# Altium footprint library myPCBLib (AirPC's conflicted copy 2014-06-14).PcbLib: 57 footprints (part 1 of 4)
Each footprint in its own frame and in the unit in brackets; x right, y up, seen from the top. Pads: shape width x height; smd on the part's side, far side on the other; paste and mask are expansions set on the pad; w line width, h text height; cw(c..) or ccw(c..) is an arc to the next point about the centre after c.
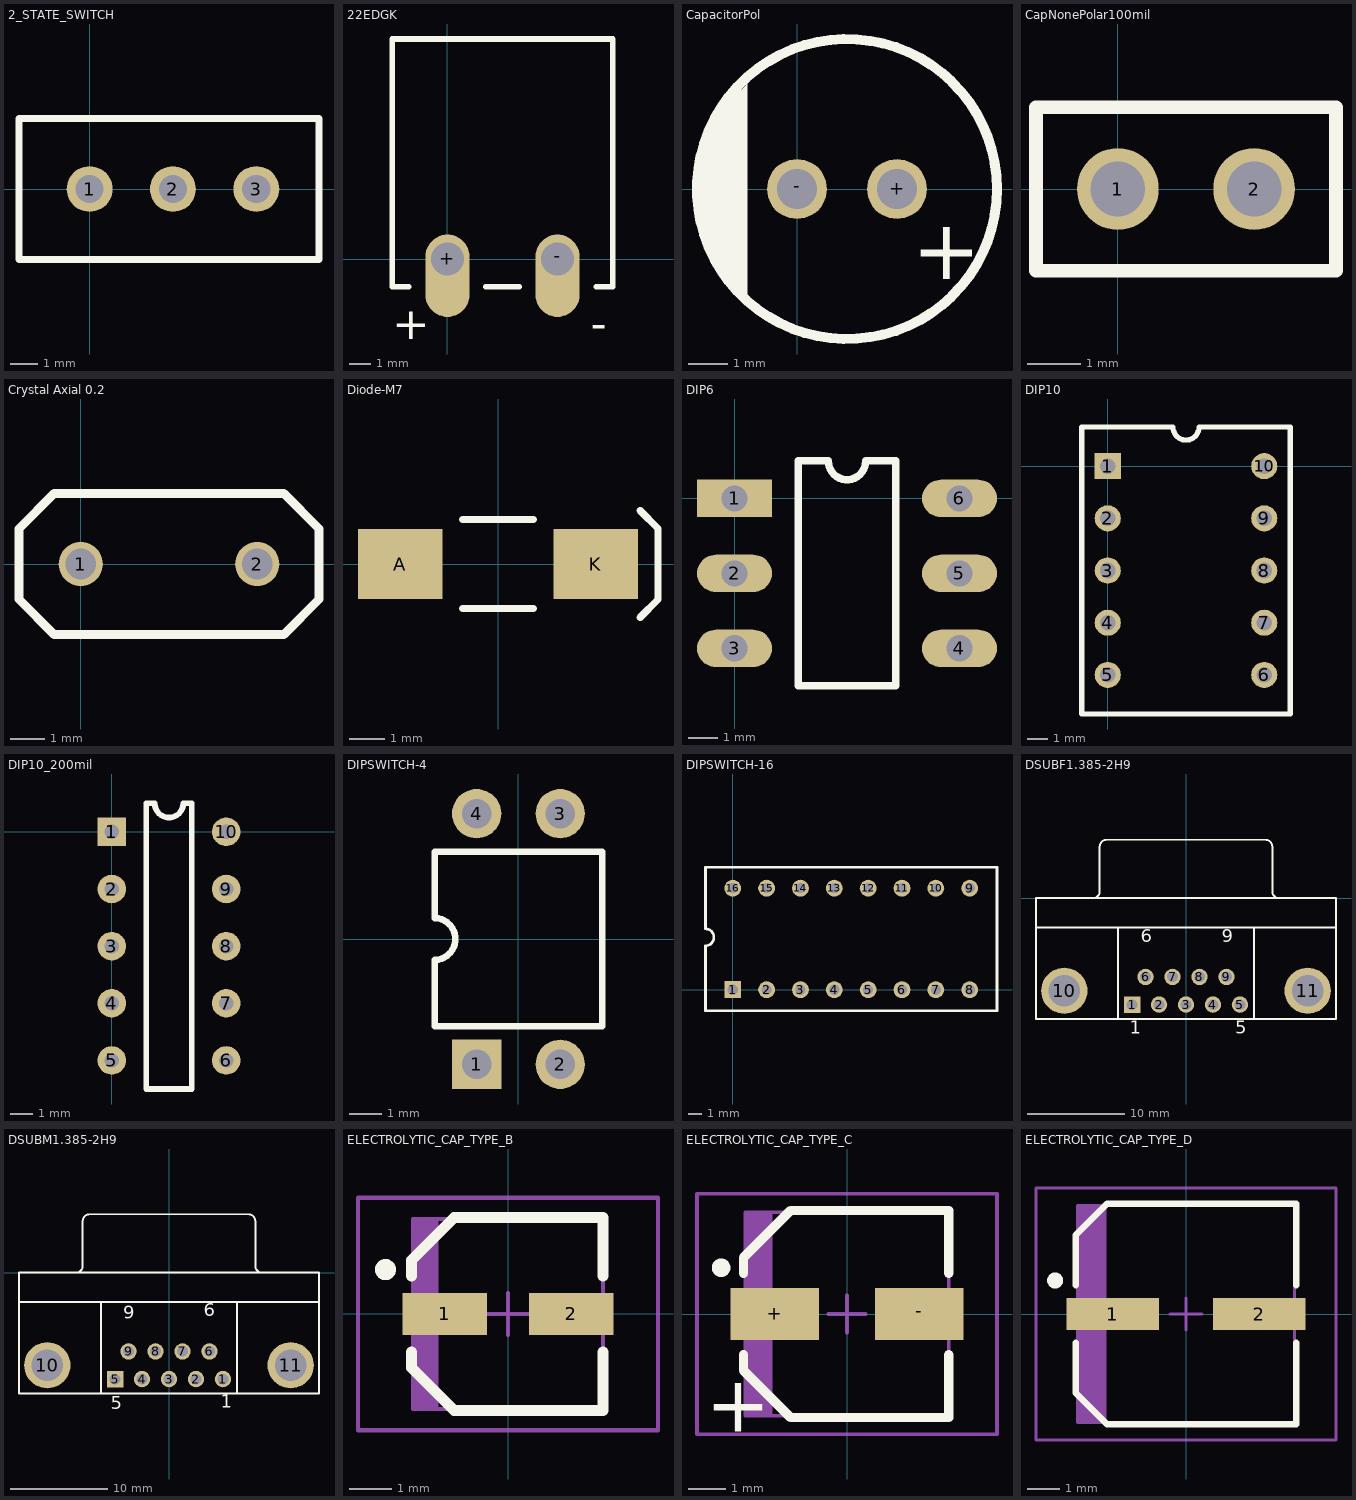
[diagram p0: the footprints below, top view; thin cyan lines are the x and y axes]

## 2_STATE_SWITCH [mil]
pads (3):
  round 65 hole 40: 1(0,0) 2(118.11,0) 3(236.22,0)
Top Overlay:
  lines w10: -100,-100 325,-100 325,100 -100,100 -100,-100

## 22EDGK [mil] "2 pin green connector"
height 314.96
pads (2):
  oval 80x150 hole 60 copper offset 0,-30: +(0,0) -(200,0)
Top Overlay:
  lines w10: -70,-50 -100,-50 -100,400 300,400 300,-50 270,-50 ; 70,-50 130,-50
  text "+" at -100,-145 h60
  text "-" at 260,-145 h60

## CapacitorPol [mil]
pads (2):
  round 60 hole 40: +(100,0) -(0,0)
Top Overlay:
  circle w10: c50,0 r150
  region: -50,105 -50,-110 -70,-90 -100,-25 -100,25 -80,75
  text "+" at 115,-90 h60

## CapNonePolar100mil [mil]
pads (2):
  round 60 hole 40: 1(0,0) 2(100,0)
Top Overlay:
  lines w10: -60,-60 160,-60 160,60 -60,60 -60,-60

## Crystal Axial 0.2 [mil]
pads (2):
  round 50 hole 35: 1(0,0) 2(200,0)
Top Overlay:
  lines w10: -70,-40 -70,40 -30,80 230,80 270,40 270,-40 230,-80 -30,-80 -70,-40

## Diode-M7 [mil]
pads (2):
  rect 95x78.74 smd: A(-110,0) K(110,0)
Top Overlay:
  lines w7.87: -40,-50 40,-50 ; -40,50 40,50
  lines w8: 160,-60 180,-40 180,40 160,60

## DIP6 [mil]
pads (6):
  rect 100x50 hole 35: 1(0,0)
  oval 100x50 hole 35: 2(0,-100) 3(0,-200) 4(300,-200) 5(300,-100) 6(300,0)
Top Overlay:
  lines w10: 85,-250 85,50 125,50 ccw(c150,50) 175,50 215,50 215,-250 85,-250

## DIP10 [mil]
pads (10):
  rect 50x50 hole 30: 1(0,0)
  round 50 hole 30: 2(0,-100) 3(0,-200) 4(0,-300) 5(0,-400) 6(300,-400) 7(300,-300) 8(300,-200) 9(300,-100) 10(300,0)
Top Overlay:
  lines w10: -50,-475 -50,75 125,75 ccw(c150,75) 175,75 350,75 350,-475 -50,-475

## DIP10_200mil [mil]
pads (10):
  rect 50x50 hole 25: 1(0,0)
  round 50 hole 25: 2(0,-100) 3(0,-200) 4(0,-300) 5(0,-400) 6(200,-400) 7(200,-300) 8(200,-200) 9(200,-100) 10(200,0)
Top Overlay:
  lines w10: 60,-450 60,50 75,50 ccw(c100,50) 125,50 140,50 140,-450 60,-450

## DIPSWITCH-4 [mm]
pads (4):
  rect 1.5x1.5 hole 0.9: 1(-1.27,-3.81)
  round 1.5 hole 0.9: 2(1.27,-3.81) 3(1.27,3.81) 4(-1.27,3.81)
Top Overlay:
  lines w0.2: -2.55,-2.65 -2.55,-0.635 ccw(c-2.55,0) -2.55,0.635 -2.55,2.65 2.55,2.65 2.55,-2.65 -2.55,-2.65
3D body: height 6.3, standoff -4, extent -3.032,-4.8 3.048,4.8

## DIPSWITCH-16 [mil]
pads (16):
  rect 50x50 hole 30: 1(0,0)
  round 50 hole 30: 2(100,0) 3(200,0) 4(300,0) 5(400,0) 6(500,0) 7(600,0) 8(700,0) 9(700,300) 10(600,300) 11(500,300) 12(400,300) 13(300,300) 14(200,300) 15(100,300) 16(0,300)
Top Overlay:
  lines w7.87: -80.71,179.92 cw(c-80.71,154.92) -80.71,129.92 -80.71,-62.6 780.71,-62.6 780.71,362.21 -80.71,362.21 -80.71,181.1
3D body: height 248.03, standoff -157.48, extent -70,-43.98 769.37,333.98

## DSUBF1.385-2H9 [mm]
pads (11):
  rect 1.69x1.69 hole 1.09: 1(-5.54,-10.92)
  round 1.69 hole 1.09: 2(-2.77,-10.92) 3(0,-10.92) 4(2.77,-10.92) 5(5.54,-10.92) 6(-4.155,-8.08) 7(-1.385,-8.08) 8(1.385,-8.08) 9(4.155,-8.08)
  round 4.76 hole 3.26: 10(-12.495,-9.5) 11(12.495,-9.5)
Top Overlay:
  lines w0.2: -15.4,-3 15.4,-3 ; -9.56,0.005 ccw(c-9.56,0.7) -8.865,0.7 -8.865,5.3 ; -8.86,5.305 cw(c-8.165,5.305) -8.165,6 8.165,6 cw(c8.165,5.305) 8.86,5.305 ; -7,-12.4 -7,-3 ; 7,-12.4 7,-3 ; 8.865,5.3 8.865,0.7 ccw(c9.56,0.7) 9.56,0.005 ; -15.4,-12.4 -15.4,0 15.4,0 15.4,-12.4 -15.4,-12.4
  text "1" at -5.79,-14.375 h2.29
  text "5" at 5.04,-14.375 h2.29
  text "9" at 3.655,-4.975 h2.29
  text "6" at -4.655,-4.975 h2.29
3D body: height 12.62, standoff -4.25, extent -15.443,-12.458 15.367,5.842

## DSUBM1.385-2H9 [mm]
pads (11):
  round 1.69 hole 1.09: 1(5.54,-10.92) 2(2.77,-10.92) 3(0,-10.92) 4(-2.77,-10.92) 6(4.155,-8.08) 7(1.385,-8.08) 8(-1.385,-8.08) 9(-4.155,-8.08)
  rect 1.69x1.69 hole 1.09: 5(-5.54,-10.92)
  round 4.76 hole 3.26: 10(-12.495,-9.5) 11(12.495,-9.5)
Top Overlay:
  lines w0.2: -15.4,-3 15.4,-3 ; -9.56,0.005 ccw(c-9.56,0.7) -8.865,0.7 -8.865,5.3 ; -8.86,5.305 cw(c-8.165,5.305) -8.165,6 8.165,6 cw(c8.165,5.305) 8.86,5.305 ; -7,-12.4 -7,-3 ; 7,-12.4 7,-3 ; 8.865,5.3 8.865,0.7 ccw(c9.56,0.7) 9.56,0.005 ; -15.4,-12.4 -15.4,0 15.4,0 15.4,-12.4 -15.4,-12.4
  text "1" at 5.334,-14.351 h2.29
  text "5" at -5.969,-14.478 h2.29
  text "9" at -4.699,-5.207 h2.29
  text "6" at 3.556,-4.953 h2.29
3D body: height 12.62, standoff -4.25, extent -15.494,-12.319 15.316,6.281

## ELECTROLYTIC_CAP_TYPE_B [mm]
pads (2):
  rect 2x1 smd: 1(-1.5,0) 2(1.5,0)
Top Overlay:
  circle w0.25: c-2.9,1.05 r0.125
  lines w0.254: -2.286,-0.9 -2.286,-1.27 -1.27,-2.286 2.25,-2.286 ; -2.286,0.9 -2.286,1.27 -1.27,2.286 2.25,2.286 ; 2.25,-2.25 2.25,-0.9 ; 2.25,0.9 2.25,2.25
Mechanical 13:
  rectangle: -2.25,-2.25 -1.645,2.25
  lines w0.1: -2.25,-2.25 2.25,-2.25 2.25,2.25 -2.25,2.25 -2.25,-2.25
Mechanical 15:
  lines w0.1: -0.5,0 0.5,0 ; 0,-0.5 0,0.5 ; -3.55,-2.75 3.55,-2.75 3.55,2.75 -3.55,2.75 -3.55,-2.75
3D body: height 5.4, standoff 0, extent -2.3,-2.159 2.3,2.141

## ELECTROLYTIC_CAP_TYPE_C [mm]
pads (2):
  rect 2.4x1.4 smd: +(-1.95,0) -(1.95,0)
Top Overlay:
  circle w0.25: c-3.4,1.25 r0.125
  lines w0.254: -2.794,-1.1 -2.794,-1.524 -1.524,-2.794 2.75,-2.794 ; -2.794,1.1 -2.794,1.524 -1.524,2.794 2.75,2.794 ; 2.75,-2.75 2.75,-1.1 ; 2.75,1.1 2.75,2.75
  text "+" at -3.81,-3.175 h1.52
Mechanical 13:
  rectangle: -2.75,-2.75 -2.01,2.75
  lines w0.1: -2.75,-2.75 -2.75,2.75 2.75,2.75 2.75,-2.75 -2.75,-2.75
Mechanical 15:
  lines w0.1: -0.5,0 0.5,0 ; 0,-0.5 0,0.5 ; -4.05,-3.25 -4.05,3.25 4.05,3.25 4.05,-3.25 -4.05,-3.25
3D body: height 5.41, standoff 0, extent -3.048,-2.667 2.852,2.633

## ELECTROLYTIC_CAP_TYPE_D [mm]
pads (2):
  rect 2.9x1 smd: 1(-2.3,0) 2(2.3,0)
Top Overlay:
  circle w0.25: c-4.1,1.05 r0.125
  lines w0.2: -3.45,-0.9 -3.45,-2.475 -2.475,-3.45 3.45,-3.45 3.45,-0.9 ; -3.45,0.9 -3.45,2.475 -2.475,3.45 3.45,3.45 3.45,0.9
Mechanical 13:
  rectangle: -3.4,-3.4 -2.485,3.4
  lines w0.1: -3.4,-3.4 -3.4,3.4 3.4,3.4 3.4,-3.4 -3.4,-3.4
Mechanical 15:
  lines w0.1: -0.5,0 0.5,0 ; 0,-0.5 0,0.5 ; -4.7,-3.95 -4.7,3.95 4.7,3.95 4.7,-3.95 -4.7,-3.95
3D body: height 5.41, standoff -0.01, extent -3.525,-3.325 3.475,3.275